# Altium footprint library PBL - THD Packages.PcbLib: 256 footprints (part 12 of 16)
Each footprint in its own frame and in the unit in brackets; x right, y up, seen from the top. Pads: shape width x height; smd on the part's side, far side on the other; paste and mask are expansions set on the pad; w line width, h text height; cw(c..) or ccw(c..) is an arc to the next point about the centre after c.
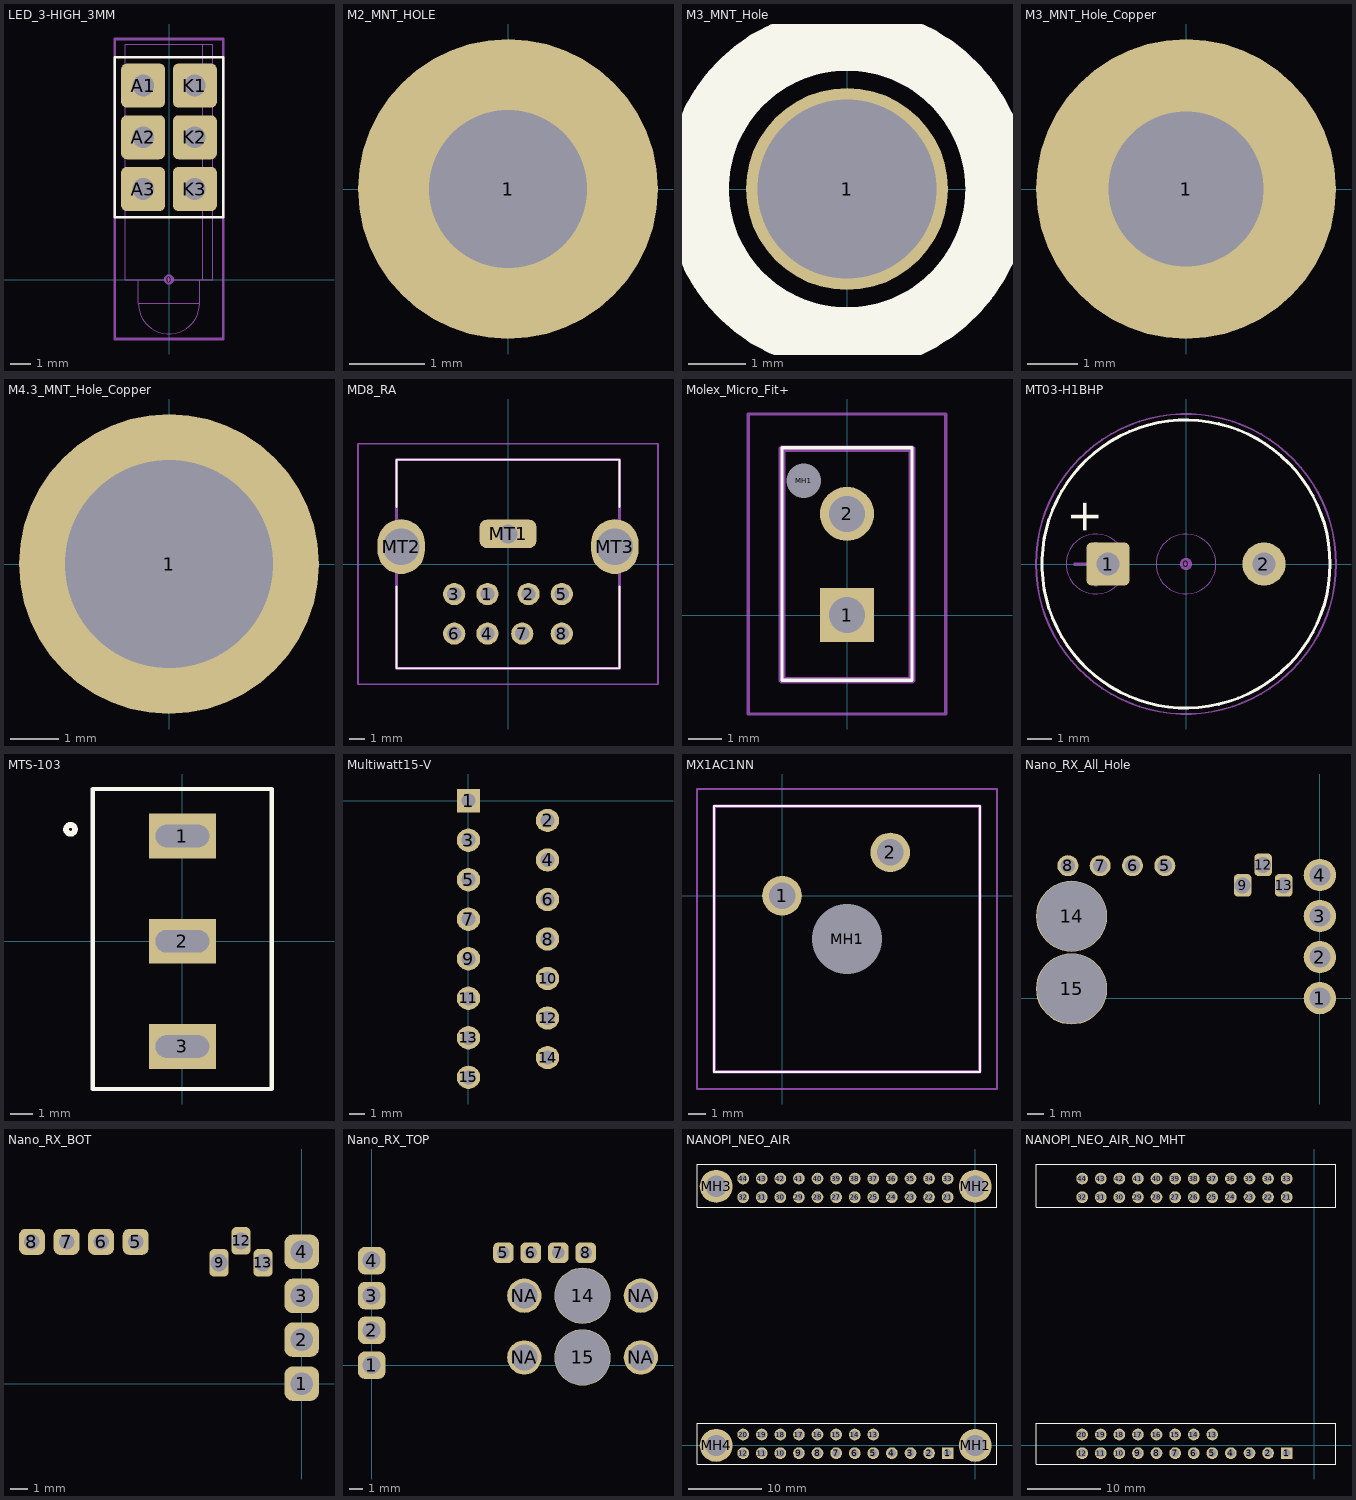
[diagram p11: the footprints below, top view; thin cyan lines are the x and y axes]

## LED_3-HIGH_3MM [mil] "LED Circuit Board Indicator Tri-Level"
height 600
pads (7):
  round 20 on Mech15: 0(0,0)
  rrect25% 85x85 hole 42: A1(-50,375) A2(-50,275) A3(-50,175) K1(50,375) K2(50,275) K3(50,175)
Top Overlay:
  lines w5: -105,120 105,120 105,430 -105,430 -105,120
13 - 3D Top Side:
  lines w1.97: -59.06,0 -59.06,-46.06 ; 59.06,0 59.06,-46.06 ; 65.35,0 65.35,455.12 ; -59.06,-46.06 ccw(c0,-46.06) 59.06,-46.06 ; -59.06,-46.06 59.06,-46.06 ; -85.04,0 85.04,0 85.04,455.12 -85.04,455.12 -85.04,0
15 - Top Courtyards:
  lines w5: -105,-115 105,-115 105,465 -105,465 -105,-115
3D body "LED bar 3-high 3mm.STEP": height 600, standoff -144.88, extent -85.04,-105.11 85.04,455.12

## M2_MNT_HOLE [mm] "M2 Mounting hole"
pads (1):
  round 4 hole 2.1: 1(0,0)

## M3_MNT_Hole [mm] "M3_MNT_Hole"
pads (1):
  round 3.5 / inner round 3.1 / far side round 3.5 hole 3.1: 1(0,0)
Top Overlay:
  circle w1.1: c0,0 r2.6
Bottom Overlay:
  circle w1.1: c0,0 r2.6

## M3_MNT_Hole_Copper [mm] "M3_MNT_Hole"
pads (1):
  round 6 hole 3.1: 1(0,0)

## M4.3_MNT_Hole_Copper [mm] "M3_MNT_Hole"
pads (1):
  round 6.2 hole 4.3: 1(0,0)

## MD8_RA [mm]
pads (11):
  round 1.4 hole 0.9: 1(-1.3,-1.9) 2(1.3,-1.9) 3(-3.4,-1.9) 4(-1.3,-4.4) 5(3.4,-1.9) 6(-3.4,-4.4) 7(0.9,-4.4) 8(3.4,-4.4)
  rrect50% 3.6x1.8 hole 1.2 square: MT1(0,1.9)
  oval 3x3.463 hole 2.309: MT2(-6.75,1.1) MT3(6.75,1.1)
Top Overlay:
  lines w0.1: -7.05,-1.4 -7.05,-6.6 7.05,-6.6 7.05,-1.4 ; -7.05,3.6 -7.05,6.6 7.05,6.6 7.05,3.6
13 - 3D Top Side:
  lines w0.2: -7.05,-6.6 7.05,-6.6 7.05,6.6 -7.05,6.6 -7.05,-6.6
15 - Top Courtyards:
  lines w0.1: -9.482,-7.6 9.482,-7.6 9.482,7.6 -9.482,7.6 -9.482,-7.6
3D body "MD6_RA.stp": height 13.05, standoff -3.46, extent -7,-6.213 7.001,6.613

## Molex_Micro_Fit+ [mm] "molex micro fir +"
pads (3):
  rect 1.605x1.605 hole 1.07: 1(0,0)
  round 1.605 hole 1.07: 2(0,3)
  round 0.51 hole 1.02 unplated: MH1(-1.28,3.98)
Top Overlay:
  lines w0.1: -1.925,-1.93 1.925,-1.93 1.925,4.96 -1.925,4.96 -1.925,-1.93
13 - 3D Top Side:
  lines w0.2: -1.925,-1.93 1.925,-1.93 1.925,4.93 -1.925,4.93 -1.925,-1.93
15 - Top Courtyards:
  lines w0.1: -2.925,-2.93 2.925,-2.93 2.925,5.96 -2.925,5.96 -2.925,-2.93
3D body "2068320201.stp": height 10.01, standoff -5, extent -1.925,-1.93 1.925,4.93

## MT03-H1BHP [mm]
height 10.008
pads (3):
  round 0.508 on Mech15: 0(0,0)
  rrect25% 1.8x1.8 hole 0.965: 1(-3.25,0)
  round 1.8 hole 0.965: 2(3.25,0)
Top Overlay:
  circle w0.127: c0,0 r6
  text "+" at -3.2,1.2 h2.29
13 - 3D Top Side:
  circle w0.05: c0,0 r6.25
  circle w0.05: c-3.75,0 r1.25
  circle w0.05: c0,0 r5.996
  circle w0.05: c0,0 r1.25
  circle w0.076: c0.003,-0.012 r6
  lines w0.05: -4.65,-0.05 -4.65,0.05 ; -4.65,-0.05 -4.625,-0.025 ; -4.65,-0.05 -3.775,-0.05 ; -4.65,0.05 -4.625,0.025 ; -4.65,0.05 -3.775,0.05 ; -4.625,-0.025 -4.625,0.025 ; -4.625,-0.025 -3.8,-0.025 ; -4.625,0.025 -3.8,0.025 ; -3.8,-0.9 -3.8,-0.025 ; -3.8,-0.9 -3.775,-0.875 ; -3.8,-0.9 -3.7,-0.9 ; -3.8,-0.025 cw(c-3.8,-0.05) -3.775,-0.05 ; -3.8,0.025 ccw(c-3.8,0.05) -3.775,0.05 ; -3.8,0.025 -3.8,0.9 ; -3.8,0.9 -3.7,0.9 ; -3.8,0.9 -3.775,0.875 ; -3.775,-0.875 -3.775,-0.05 ; -3.775,-0.875 -3.725,-0.875 ; -3.775,0.05 -3.775,0.875 ; -3.775,0.875 -3.725,0.875 ; -3.725,-0.875 -3.725,-0.05 ; -3.725,-0.875 -3.7,-0.9 ; -3.725,-0.05 cw(c-3.7,-0.05) -3.7,-0.025 ; -3.725,-0.05 -2.85,-0.05 ; -3.725,0.05 ccw(c-3.7,0.05) -3.7,0.025 ; -3.725,0.05 -3.725,0.875 ; -3.725,0.05 -2.85,0.05 ; -3.725,0.875 -3.7,0.9 ; -3.7,-0.9 -3.7,-0.025 ; -3.7,-0.025 -2.875,-0.025 ; -3.7,0.025 -2.875,0.025 ; -3.7,0.025 -3.7,0.9 ; -2.875,-0.025 -2.85,-0.05 ; -2.875,-0.025 -2.875,0.025 ; -2.875,0.025 -2.85,0.05 ; -2.85,-0.05 -2.85,0.05
15 - Top Courtyards:
  circle w0.076: c0,0 r6.25
3D body "Buzzer MT03-H1BHP.STEP": height 10, standoff -2.8, extent -6.249,-6.249 6.25,6.25

## MTS-103 [mm] "MTS-103 3-way switch"
pads (3):
  rect 3x2 hole 1 slot 2.4 at 0 deg mask+0.05: 1(0,4.7) 2(0,0) 3(0,-4.7)
Top Overlay:
  circle w0.254: c-5,5 r0.2
  lines w0.2: -4,-6.6 4,-6.6 4,6.8 -4,6.8 -4,-6.6
3D body "MTS-1xx-A2-blue.step": height 30.13, standoff -5.5, extent -5.999,-6.6 5.999,6.792

## Multiwatt15-V [mm]
pads (15):
  rect 1.5x1.5 hole 0.9: 1(0,0)
  round 1.5 hole 0.9: 2(5.08,-1.27) 3(0,-2.54) 4(5.08,-3.81) 5(0,-5.08) 6(5.08,-6.35) 7(0,-7.62) 8(5.08,-8.89) 9(0,-10.16) 10(5.08,-11.43) 11(0,-12.7) 12(5.08,-13.97) 13(0,-15.24) 14(5.08,-16.51) 15(0,-17.78)
3D body "User Library-Multiwatt15V.STEP": height 21.3, standoff -1, extent -0.246,-18.669 9.644,0.931

## MX1AC1NN [mil]
pads (3):
  round 91.5 hole 61: 1(0,0) 2(250,100)
  round 80.51 hole 161 unplated: MH1(150,-100)
Top Overlay:
  lines w3.94: -157.09,-407.09 -157.09,207.09 457.09,207.09 457.09,-407.09 -157.09,-407.09
13 - 3D Top Side:
  lines w7.87: -157.09,-407.09 -157.09,207.09 457.09,207.09 457.09,-407.09 -157.09,-407.09
15 - Top Courtyards:
  lines w3.94: -196.46,-446.46 -196.46,246.46 496.46,246.46 496.46,-446.46 -196.46,-446.46

## Nano_RX_All_Hole [mm]
pads (13):
  round 2 hole 1.31: 1(0,0) 2(0,2.54) 3(0,5.08) 4(0,7.62)
  round 1.3 hole 0.9: 5(-9.6,8.2) 6(-11.6,8.2) 7(-13.6,8.2) 8(-15.6,8.2)
  rrect50% 1.1x1.4 hole 1: 9(-4.78,6.985) 12(-3.51,8.255) 13(-2.24,6.985)
  round 4.4 hole 4.3: 14(-15.375,5.07) 15(-15.375,0.57)

## Nano_RX_BOT [mm]
pads (11):
  rrect50% 2x2 hole 1.3: 1(0,0) 2(0,2.54) 3(0,5.08) 4(0,7.62)
  rrect50% 1.5x1.5 hole 0.9: 5(-9.6,8.2) 6(-11.6,8.2) 7(-13.6,8.2) 8(-15.6,8.2)
  rrect50% 1.1x1.6 hole 1: 9(-4.78,6.985) 12(-3.51,8.255) 13(-2.24,6.985)

## Nano_RX_TOP [mm]
pads (14):
  rrect50% 2x2 hole 1.31: 1(0,0) 2(0,2.54) 3(0,5.08) 4(0,7.62)
  rrect50% 1.5x1.5 hole 0.9: 5(9.6,8.2) 6(11.6,8.2) 7(13.6,8.2) 8(15.6,8.2)
  round 4.1 hole 4: 14(15.375,5.07) 15(15.375,0.57)
  round 2.5 hole 1.9: NA(11.125,0.57) NA(11.125,5.07) NA(19.625,0.57) NA(19.625,5.07)
3D body "U.FLP-ML51.J-PA(F)-ST.stp": height 4.17, standoff -18.6, extent 9.35,2.97 21.35,7.17
3D body "U.FLP-ML51.J-PA(F)-ST.stp": height 4.17, standoff -18.6, extent 9.35,-1.53 21.35,2.67

## NANOPI_NEO_AIR [mm]
pads (48):
  rect 1.6x1.6 hole 1.1 mask+0.102: 1(-3.774,-1.055)
  round 1.6 hole 1.1: 2(-6.314,-1.055) 3(-8.854,-1.055) 4(-11.394,-1.055) 5(-13.934,-1.055) 6(-16.474,-1.055) 7(-19.014,-1.055) 8(-21.554,-1.055) 9(-24.094,-1.055) 10(-26.634,-1.055) 11(-29.174,-1.055) 12(-31.714,-1.055) 13(-13.934,1.485) 14(-16.474,1.485) 15(-19.014,1.485) 16(-21.554,1.485) 17(-24.094,1.485) 18(-26.634,1.485) 19(-29.174,1.485) 20(-31.714,1.485) 21(-3.774,33.915) 22(-6.314,33.915) 23(-8.854,33.915) 24(-11.394,33.915) 25(-13.934,33.915) 26(-16.474,33.915) 27(-19.014,33.915) 28(-21.554,33.915) 29(-24.094,33.915) 30(-26.634,33.915) 31(-29.174,33.915) 32(-31.714,33.915) 33(-3.774,36.455) 34(-6.314,36.455) 35(-8.854,36.455) 36(-11.394,36.455) 37(-13.934,36.455) 38(-16.474,36.455) 39(-19.014,36.455) 40(-21.554,36.455) 41(-24.094,36.455) 42(-26.634,36.455) 43(-29.174,36.455) 44(-31.714,36.455)
  round 4.5 hole 2.9: MH1(0,0) MH2(0,35.4) MH3(-35.4,35.4) MH4(-35.4,0)
Top Overlay:
  lines w0.1: -37.973,-2.54 -37.973,3.048 2.921,3.048 2.921,-2.54 -37.973,-2.54 ; -37.973,32.512 2.921,32.512 2.921,38.448 -37.973,38.448 -37.973,32.512
3D body "NanoPi-NEO-Air-ASSY.STEP": height 14.15, standoff -3.09, extent -37.792,-2.3 2.792,37.805

## NANOPI_NEO_AIR_NO_MHT [mm]
pads (44):
  rect 1.6x1.6 hole 1.1 mask+0.102: 1(-3.774,-1.055)
  round 1.6 hole 1.1: 2(-6.314,-1.055) 3(-8.854,-1.055) 4(-11.394,-1.055) 5(-13.934,-1.055) 6(-16.474,-1.055) 7(-19.014,-1.055) 8(-21.554,-1.055) 9(-24.094,-1.055) 10(-26.634,-1.055) 11(-29.174,-1.055) 12(-31.714,-1.055) 13(-13.934,1.485) 14(-16.474,1.485) 15(-19.014,1.485) 16(-21.554,1.485) 17(-24.094,1.485) 18(-26.634,1.485) 19(-29.174,1.485) 20(-31.714,1.485) 21(-3.774,33.915) 22(-6.314,33.915) 23(-8.854,33.915) 24(-11.394,33.915) 25(-13.934,33.915) 26(-16.474,33.915) 27(-19.014,33.915) 28(-21.554,33.915) 29(-24.094,33.915) 30(-26.634,33.915) 31(-29.174,33.915) 32(-31.714,33.915) 33(-3.774,36.455) 34(-6.314,36.455) 35(-8.854,36.455) 36(-11.394,36.455) 37(-13.934,36.455) 38(-16.474,36.455) 39(-19.014,36.455) 40(-21.554,36.455) 41(-24.094,36.455) 42(-26.634,36.455) 43(-29.174,36.455) 44(-31.714,36.455)
Top Overlay:
  lines w0.1: -37.973,-2.54 -37.973,3.048 2.921,3.048 2.921,-2.54 -37.973,-2.54 ; -37.973,32.512 2.921,32.512 2.921,38.448 -37.973,38.448 -37.973,32.512
3D body "NanoPi-NEO-Air-ASSY.STEP": height 14.15, standoff -3.09, extent -37.792,-2.3 2.792,37.805